# Altium footprint library AD常用3D封装.PCBLIB: 343 footprints (part 2 of 22)
Each footprint in its own frame and in the unit in brackets; x right, y up, seen from the top. Pads: shape width x height; smd on the part's side, far side on the other; paste and mask are expansions set on the pad; w line width, h text height; cw(c..) or ccw(c..) is an arc to the next point about the centre after c.
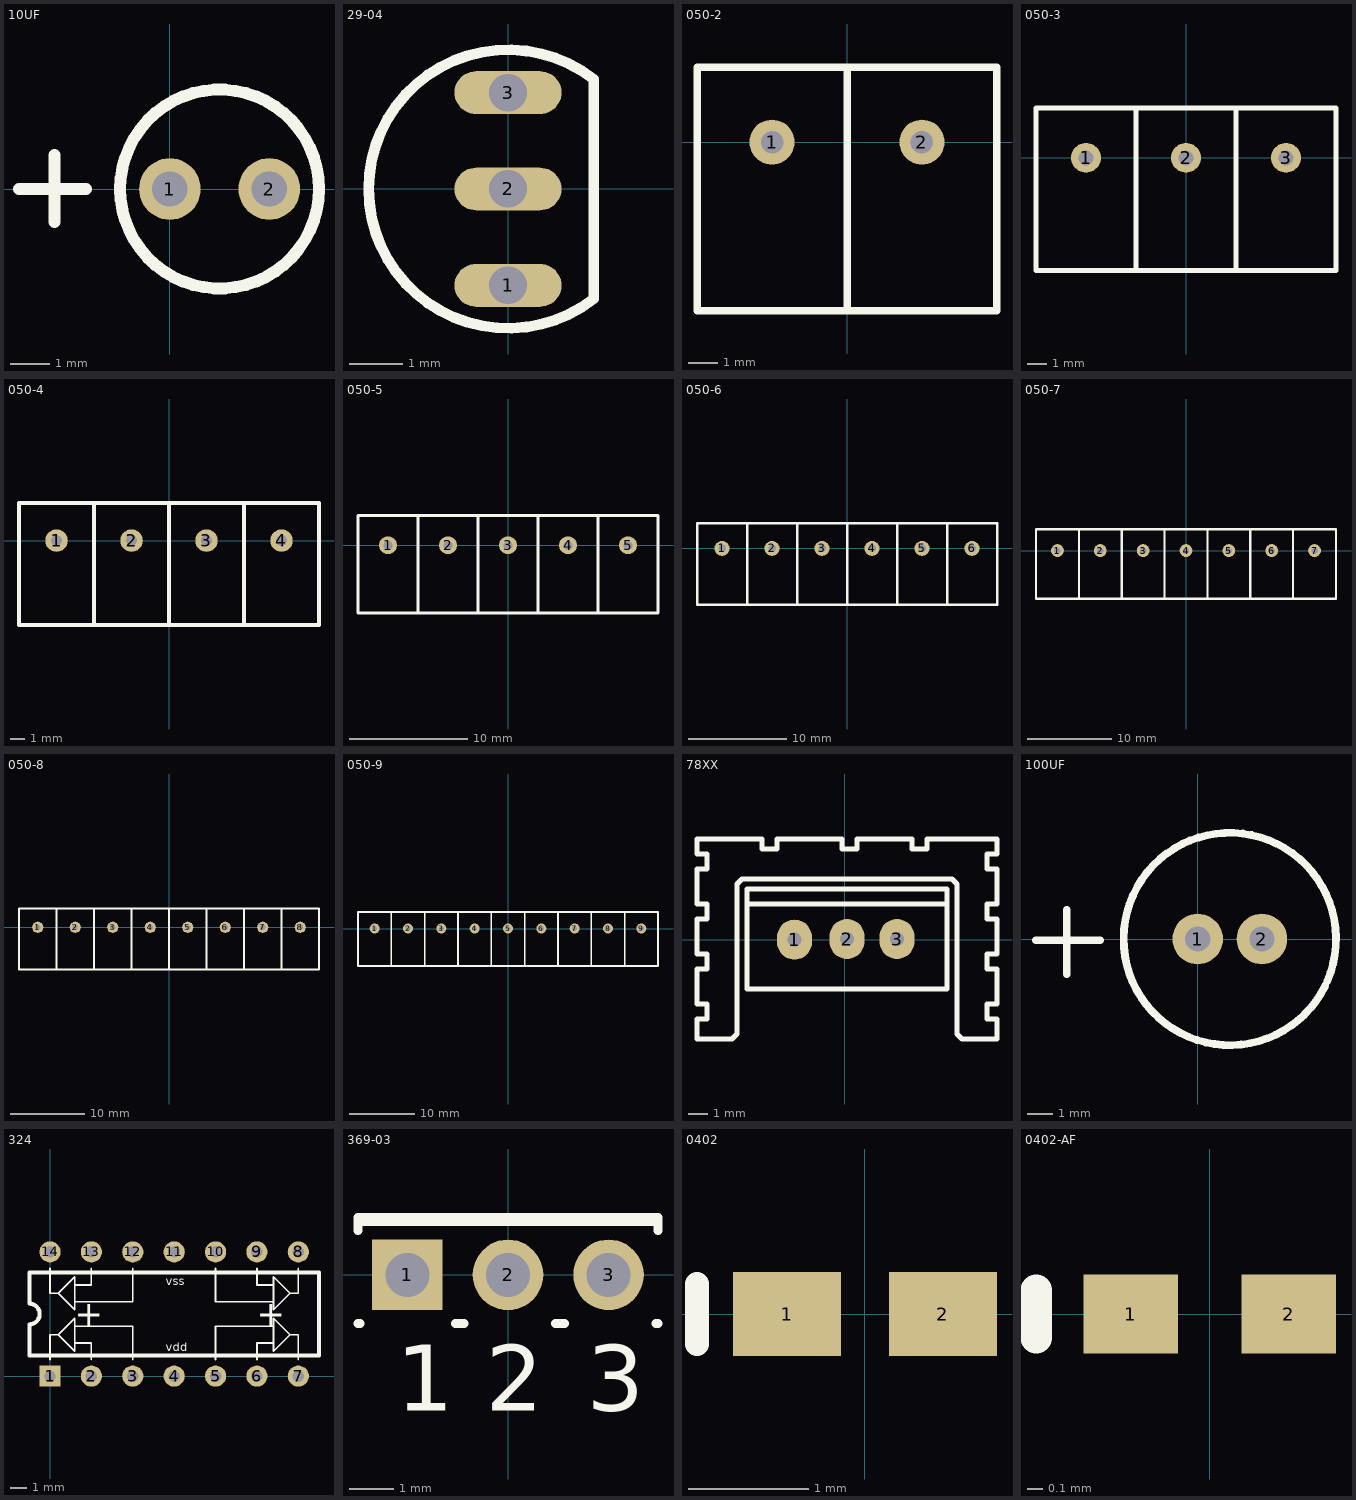
[diagram p1: the footprints below, top view; thin cyan lines are the x and y axes]

## 10UF [mil]
pads (2):
  round 62 hole 35.43: 1(0,0) 2(100,0)
TopOverlay:
  circle w12: c50,0 r100
  lines w12: -151.69,0 -84.17,0 ; -115.87,-33.27 -115.87,34.25

## 29-04 [mm] "TO, Flat Index; 3 In-Line, Axial Leads; Body Dia. 4.8mm; Leads 0.48 x 0.5 mm (max)"
height 5.33
pads (3):
  oval 2x0.8 hole 0.7: 1(0,-1.8) 2(0,0) 3(0,1.8)
TopOverlay:
  lines w0.2: 1.601,-2.049 cw(c0,0) 1.601,2.049 ; 1.6,-1.99 1.6,1.99
3D body: height 3, standoff 0, extent -0.25,-2.04 0.25,-1.6
3D body: height 3, standoff 0, extent -0.25,-0.22 0.25,0.22
3D body: height 3, standoff 0, extent -0.246,1.583 0.254,2.023
3D body: height 8, standoff 3, extent -2.612,-2.6 1.657,2.602

## 050-2 [mil]
pads (2):
  round 60 hole 30: 1(-100,0) 2(100,0)
TopOverlay:
  lines w10: 0,-225 0,100 ; -200,-225 200,-225 200,100 -200,100 -200,-225
3D body: height 440.94, standoff -70.87, extent -198.42,-216.52 195.28,98.44

## 050-3 [mil]
pads (3):
  round 60 hole 30: 1(-200,0) 2(0,0) 3(200,0)
TopOverlay:
  lines w10: -100,-225 -100,100 ; 100,-225 300,-225 300,100 100,100 ; 100,-225 100,100 ; 100,-225 -300,-225 -300,100 100,100
3D body: height 440.94, standoff -70.87, extent -295.28,-218 295.27,96.96

## 050-4 [mil]
pads (4):
  round 60 hole 30: 1(-300,0) 2(-100,0) 3(100,0) 4(300,0)
TopOverlay:
  lines w10: -200,-225 -200,100 ; 0,-225 -400,-225 -400,100 0,100 ; 0,-225 0,100 ; 0,-225 200,-225 ; 0,100 200,100 ; 200,-225 400,-225 400,100 200,100 ; 200,-225 200,100
3D body: height 440.94, standoff -70.87, extent -393.7,-214.96 393.7,100

## 050-5 [mil]
pads (5):
  round 60 hole 30: 1(-400,0) 2(-200,0) 3(0,0) 4(200,0) 5(400,0)
TopOverlay:
  lines w10: -300,-225 -300,100 ; -100,-225 -500,-225 -500,100 -100,100 ; -100,-225 -100,100 ; -100,-225 100,-225 ; -100,100 100,100 ; 100,-225 300,-225 ; 100,-225 100,100 ; 100,100 300,100 ; 300,-225 500,-225 500,100 300,100 ; 300,-225 300,100
3D body: height 440.94, standoff -70.87, extent -492.12,-214.96 492.13,100

## 050-6 [mil]
pads (6):
  round 60 hole 30: 1(-500,0) 2(-300,0) 3(-100,0) 4(100,0) 5(300,0) 6(500,0)
TopOverlay:
  lines w10: -400,-225 -400,100 ; -200,-225 -600,-225 -600,100 -200,100 ; -200,-225 -200,100 ; -200,-225 0,-225 ; -200,100 0,100 ; 0,-225 200,-225 ; 0,-225 0,100 ; 0,100 200,100 ; 200,-225 400,-225 ; 200,-225 200,100 ; 200,100 400,100 ; 400,-225 600,-225 600,100 400,100 ; 400,-225 400,100
3D body: height 440.94, standoff -70.87, extent -590.55,-214.96 590.55,100

## 050-7 [mil]
pads (7):
  round 60 hole 30: 1(-600,0) 2(-400,0) 3(-200,0) 4(0,0) 5(200,0) 6(400,0) 7(600,0)
TopOverlay:
  lines w10: -500,-225 -500,100 ; -300,-225 -100,-225 ; -300,-225 -300,100 ; -300,-225 -700,-225 -700,100 -300,100 ; -300,100 -100,100 ; -100,-225 -100,100 ; -100,-225 100,-225 ; -100,100 100,100 ; 100,-225 100,100 ; 100,-225 300,-225 ; 100,100 300,100 ; 300,-225 300,100 ; 300,-225 500,-225 ; 300,100 500,100 ; 500,-225 500,100 ; 500,-225 700,-225 700,100 500,100
3D body: height 440.94, standoff -70.87, extent -688.98,-214.96 688.98,100

## 050-8 [mil]
pads (8):
  round 60 hole 30: 1(-700,0) 2(-500,0) 3(-300,0) 4(-100,0) 5(100,0) 6(300,0) 7(500,0) 8(700,0)
TopOverlay:
  lines w10: -600,-225 -600,100 ; -400,-225 -200,-225 ; -400,-225 -400,100 ; -400,-225 -800,-225 -800,100 -400,100 ; -400,100 -200,100 ; -200,-225 -200,100 ; -200,-225 0,-225 ; -200,100 0,100 ; 0,-225 0,100 ; 0,-225 200,-225 ; 0,100 200,100 ; 200,-225 200,100 ; 200,-225 400,-225 ; 200,100 400,100 ; 400,-225 400,100 ; 400,-225 600,-225 ; 400,100 600,100 ; 600,-225 600,100 ; 600,-225 800,-225 800,100 600,100
3D body: height 440.94, standoff -70.87, extent -787.4,-225 787.4,89.96

## 050-9 [mil]
pads (9):
  round 60 hole 30: 1(-800,0) 2(-600,0) 3(-400,0) 4(-200,0) 5(0,0) 6(200,0) 7(400,0) 8(600,0) 9(800,0)
TopOverlay:
  lines w10: -700,-225 -700,100 ; -500,-225 -900,-225 -900,100 -500,100 ; -500,-225 -500,100 ; -500,-225 -300,-225 ; -500,100 -300,100 ; -300,-225 -100,-225 ; -300,-225 -300,100 ; -300,100 -100,100 ; -100,-225 100,-225 ; -100,-225 -100,100 ; -100,100 100,100 ; 100,-225 300,-225 ; 100,-225 100,100 ; 100,100 300,100 ; 300,-225 500,-225 ; 300,-225 300,100 ; 300,100 500,100 ; 500,-225 700,-225 ; 500,-225 500,100 ; 500,100 700,100 ; 700,-225 900,-225 900,100 700,100 ; 700,-225 700,100
3D body: height 440.94, standoff -70.87, extent -885.83,-225 885.83,89.96

## 78XX [mil]
pads (3):
  oval 70x80 hole 28: 1(-100,0) 2(5,1.25) 3(105,1.25)
TopOverlay:
  lines w10: -195,71.25 205,71.25 ; -295,-198.75 -295,-158.75 -275,-158.75 -275,-128.75 -295,-128.75 -295,-58.75 -275,-58.75 -275,-28.75 -295,-28.75 -295,41.25 -275,41.25 -275,71.25 -295,71.25 -295,141.25 -275,141.25 -275,171.25 -295,171.25 -295,201.25 -165,201.25 -165,181.25 -135,181.25 -135,201.25 -5,201.25 -5,181.25 25,181.25 25,201.25 135,201.25 135,181.25 165,181.25 165,201.25 305,201.25 305,171.25 285,171.25 285,141.25 305,141.25 305,71.25 285,71.25 285,41.25 305,41.25 305,-28.75 285,-28.75 285,-58.75 305,-58.75 305,-128.75 285,-128.75 285,-158.75 305,-158.75 305,-198.75 255,-198.75 235,-198.75 225,-188.75 225,111.25 215,121.25 -205,121.25 -215,111.25 -215,-188.75 -225,-198.75 -295,-198.75 ; -195,-98.75 -195,101.25 205,101.25 205,-98.75 -195,-98.75
3D body: height 0, standoff -1122.05, extent -620.97,-293.06 -365.03,203

## 100UF [mm]
pads (2):
  round 2 hole 1: 1(0,0) 2(2.54,0)
TopOverlay:
  lines w0.305: -6.395,-0.05 -3.855,-0.05 ; -5.175,-1.395 -5.175,1.145 ; 5.049,-1.834 cw(c1.27,0) 5.129,-1.658

## 324 [mm]
pads (14):
  rect 1.3x1.3 hole 0.7: 1(0,0)
  round 1.3 hole 0.7: 2(2.54,0) 3(5.08,0) 4(7.62,0) 5(10.16,0) 6(12.7,0) 7(15.24,0) 8(15.24,7.62) 9(12.7,7.62) 10(10.16,7.62) 11(7.62,7.62) 12(5.08,7.62) 13(2.54,7.62) 14(0,7.62)
TopOverlay:
  lines w0.102: 0,1.016 0,2.54 0.508,2.54 ; 0,6.604 0,5.08 0.508,5.08 ; 1.524,2.032 2.54,2.032 2.54,1.016 ; 1.524,3.048 5.08,3.048 5.08,1.016 ; 1.524,4.572 5.08,4.572 5.08,6.604 ; 1.524,5.588 2.54,5.588 2.54,6.604 ; 10.16,1.016 10.16,3.048 13.716,3.048 ; 10.16,6.604 10.16,4.572 13.716,4.572 ; 12.7,1.016 12.7,2.032 13.716,2.032 ; 12.7,6.604 12.7,5.588 13.716,5.588 ; 15.24,1.016 15.24,2.54 14.732,2.54 ; 15.24,6.604 15.24,5.08 14.732,5.08 ; 0.508,2.54 1.524,1.524 1.524,3.556 0.508,2.54 ; 0.508,5.08 1.524,6.096 1.524,4.064 0.508,5.08 ; 14.732,2.54 13.716,1.524 13.716,3.556 14.732,2.54 ; 14.732,5.08 13.716,4.064 13.716,6.096 14.732,5.08
  lines w0.254: -1.27,1.27 16.51,1.27 16.51,6.35 -1.27,6.35 -1.27,4.445 cw(c-1.27,3.81) -1.27,3.175 -1.27,1.27
  text "+" at 12.7,3.048 h1.52
  text "+" at 1.524,3.048 h1.52
  text "vss" at 7.112,5.588 h0.51
  text "vdd" at 7.112,1.524 h0.51
3D body: height 3.95, standoff -3.21, extent -2.03,0 17.27,7.62

## 369-03 [mm] "TO, Thru-Hole, Vertical, Heatsink Mounted; 3 In-Line Leads; Pitch 2.28 mm"
height 9.7
pads (3):
  rect 1.6x1.6 hole 1: 1(-2.28,0)
  round 1.6 hole 1: 2(0,0) 3(2.28,0)
TopOverlay:
  lines w0.2: -3.4,-1.1 -3.35,-1.1 ; -3.4,1 -3.4,1.3 3.4,1.3 3.4,1 ; -3.4,1.21 3.4,1.21 ; -1.19,-1.1 -0.99,-1.1 ; 1.08,-1.1 1.28,-1.1 ; 3.35,-1.1 3.4,-1.1
  text "1" at -2.53,-3.075 h1.5
  text "2" at -0.5,-3.075 h1.5
  text "3" at 1.78,-3.075 h1.5

## 0402 [mm] "Chip Capacitor; Body 1.0 x 0.5 mm (LxW typ)"
height 1.35
pads (2):
  rect 0.9x0.7 smd: 1(-0.65,0) 2(0.65,0)
TopOverlay:
  lines w0.2: -1.4,-0.25 -1.4,0.25
3D body: height 0.41, standoff 0, extent -0.575,-0.275 0.575,0.275

## 0402-AF [mm] "Chip Inductor; Body 1 x 0.5 mm (LxW typ)"
height 0.55
pads (2):
  rect 0.6x0.5 smd: 1(-0.5,0) 2(0.5,0)
TopOverlay:
  lines w0.2: -1.1,-0.15 -1.1,0.15
3D body: height 0.65, standoff -0.01, extent -0.56,-0.258 0.56,0.254